# Altium footprint library alex_footprint.PcbLib: 262 footprints (part 15 of 17)
Each footprint in its own frame and in the unit in brackets; x right, y up, seen from the top. Pads: shape width x height; smd on the part's side, far side on the other; paste and mask are expansions set on the pad; w line width, h text height; cw(c..) or ccw(c..) is an arc to the next point about the centre after c.
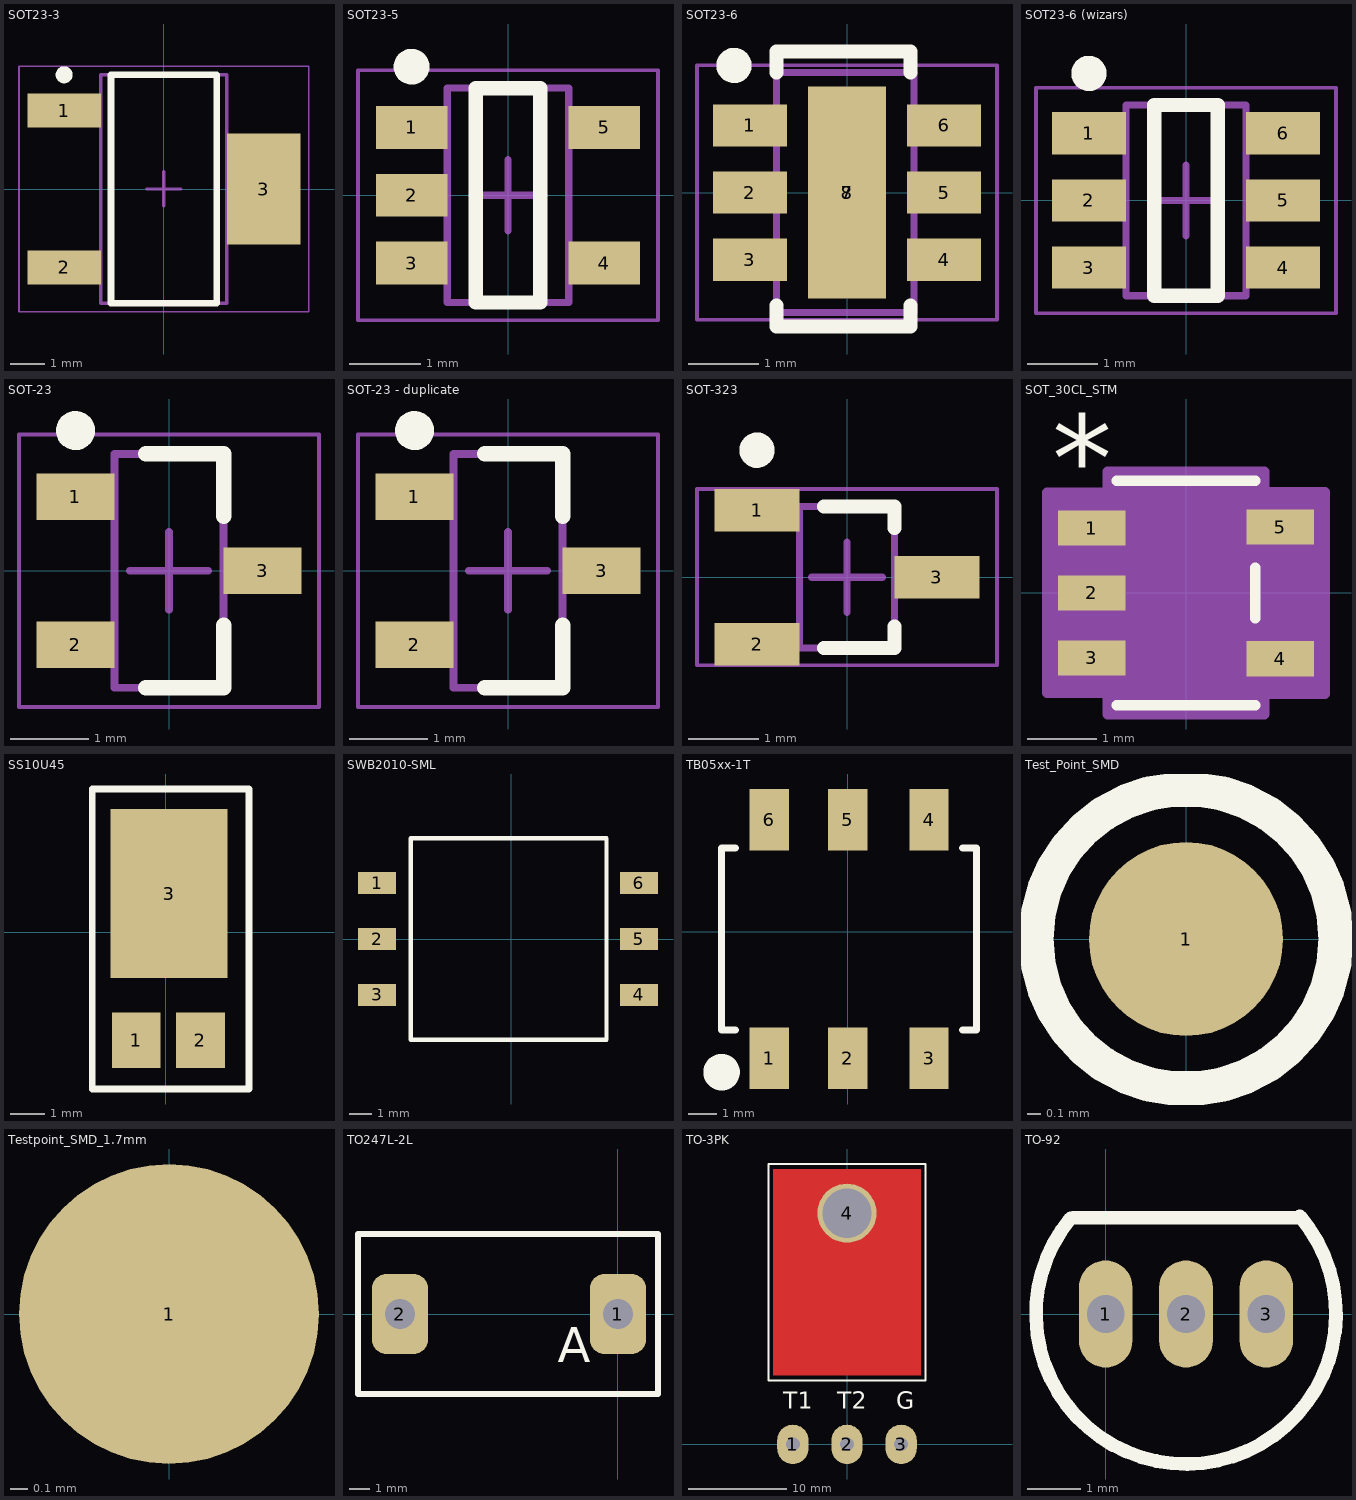
[diagram p14: the footprints below, top view; thin cyan lines are the x and y axes]

## SOT23-3 [mm] "SOT223, 4-Leads, Body 6,50x7,00mm (avg), Pitch 2,30mm, IPC Medium Density"
height 1.8
pads (3):
  rect 2.15x1 smd: 1(-2.925,2.3) 2(-2.925,-2.3)
  rect 2.15x3.25 smd: 3(2.925,0)
Top Overlay:
  circle w0.25: c-2.925,3.35 r0.125
  lines w0.2: -1.55,-3.35 -1.55,3.35 1.55,3.35 1.55,-3.35 -1.55,-3.35
Mechanical 13:
  lines w0.1: -1.85,-3.35 -1.85,3.35 1.85,3.35 1.85,-3.35 -1.85,-3.35
Mechanical 15:
  lines w0.05: -4.25,-3.6 -4.25,3.6 4.25,3.6 4.25,-3.6 -4.25,-3.6
  lines w0.1: -0.5,0 0.5,0 ; 0,-0.5 0,0.5
3D body: height 1.8, standoff 0.02, extent -1.85,-3.35 1.85,3.35

## SOT23-5 [mm] "SOT23, 5-Leads, Body 3,00x2,80mm, Pitch 0,95mm, IPC Medium Density"
height 1.25
pads (5):
  rect 1x0.6 smd: 1(-1.35,0.95) 2(-1.35,0) 3(-1.35,-0.95) 4(1.35,-0.95) 5(1.35,0.95)
Top Overlay:
  circle w0.25: c-1.35,1.8 r0.125
  lines w0.2: -0.45,-1.5 0.45,-1.5 0.45,1.5 -0.45,1.5 -0.45,-1.5
Mechanical 13:
  lines w0.1: -0.85,-1.5 -0.85,1.5 0.85,1.5 0.85,-1.5 -0.85,-1.5
Mechanical 15:
  lines w0.05: -2.1,-1.75 -2.1,1.75 2.1,1.75 2.1,-1.75 -2.1,-1.75
  lines w0.1: -0.5,0 0.5,0 ; 0,-0.5 0,0.5
3D body: height 1.25, standoff 0.1, extent -0.85,-1.5 0.85,1.5

## SOT23-6 [mm]
height 0.95
pads (8):
  rect 1.05x0.6 smd: 1(-1.375,0.95) 2(-1.375,0) 3(-1.375,-0.95) 4(1.375,-0.95) 5(1.375,0) 6(1.375,0.95)
  rect 1.1x3 smd: 7(0,0) 8(0,0)
Top Overlay:
  circle w0.25: c-1.6,1.8 r0.125
  lines w0.2: -1,-1.6 -1,-1.9 0.9,-1.9 0.9,-1.6 ; -1,1.7 -1,2 0.9,2 0.9,1.7
Mechanical 13:
  lines w0.1: -1,-1.7 -1,1.7 0.95,1.7 0.95,-1.7 -1,-1.7
Mechanical 15:
  lines w0.05: -2.125,-1.8 -2.125,1.8 2.125,1.8 2.125,-1.8 -2.125,-1.8
  lines w0.1: -0.5,0 0.5,0 ; 0,-0.5 0,0.5
3D body: height 0.95, standoff 0.1, extent -1,-1.7 1,1.7

## SOT23-6 (wizars) [mm]
height 0.95
pads (6):
  rect 1.05x0.6 smd: 1(-1.375,0.95) 2(-1.375,0) 3(-1.375,-0.95) 4(1.375,-0.95) 5(1.375,0) 6(1.375,0.95)
Top Overlay:
  circle w0.25: c-1.375,1.8 r0.125
  lines w0.2: -0.45,-1.35 -0.45,1.35 0.45,1.35 0.45,-1.35 -0.45,-1.35
Mechanical 13:
  lines w0.1: -0.85,-1.35 0.85,-1.35 0.85,1.35 -0.85,1.35 -0.85,-1.35
Mechanical 15:
  lines w0.05: -2.125,-1.6 2.125,-1.6 2.125,1.6 -2.125,1.6 -2.125,-1.6
  lines w0.1: -0.5,0 0.5,0 ; 0,-0.5 0,0.5
3D body: height 0.95, standoff 0.1, extent -0.85,-1.35 0.85,1.35

## SOT-23 [mm] "SOT23, 3-Leads, Body 3,00x2,45mm, Pitch 0,95mm, IPC Medium Density"
height 1.1
pads (3):
  rect 1x0.6 smd: 1(-1.2,0.95) 2(-1.2,-0.95) 3(1.2,0)
Top Overlay:
  circle w0.25: c-1.2,1.8 r0.125
  lines w0.2: -0.3,-1.5 0.7,-1.5 0.7,-0.7 ; -0.3,1.5 0.7,1.5 0.7,0.7
Mechanical 13:
  lines w0.1: -0.7,-1.5 -0.7,1.5 0.7,1.5 0.7,-1.5 -0.7,-1.5
Mechanical 15:
  lines w0.05: -1.925,-1.75 -1.925,1.75 1.925,1.75 1.925,-1.75 -1.925,-1.75
  lines w0.1: -0.5,0 0.5,0 ; 0,-0.5 0,0.5
3D body: height 1.1, standoff 0.05, extent -0.7,-1.5 0.7,1.5

## SOT-23 - duplicate [mm] "SOT23, 3-Leads, Body 3,00x2,45mm, Pitch 0,95mm, IPC Medium Density"
height 1.1
pads (3):
  rect 1x0.6 smd: 1(-1.2,0.95) 2(-1.2,-0.95) 3(1.2,0)
Top Overlay:
  circle w0.25: c-1.2,1.8 r0.125
  lines w0.2: -0.3,-1.5 0.7,-1.5 0.7,-0.7 ; -0.3,1.5 0.7,1.5 0.7,0.7
Mechanical 13:
  lines w0.1: -0.7,-1.5 0.7,-1.5 0.7,1.5 -0.7,1.5 -0.7,-1.5
Mechanical 15:
  lines w0.05: -1.925,-1.75 1.925,-1.75 1.925,1.75 -1.925,1.75 -1.925,-1.75
  lines w0.1: -0.5,0 0.5,0 ; 0,-0.5 0,0.5
3D body: height 1.1, standoff 0.05, extent -0.7,-1.5 0.7,1.5

## SOT-323 [mm]
height 1
pads (3):
  rect 1.2x0.6 smd: 1(-1.275,0.95) 2(-1.275,-0.95) 3(1.275,0)
Top Overlay:
  circle w0.25: c-1.275,1.8 r0.125
  lines w0.2: -0.325,-1 0.675,-1 0.675,-0.7 ; -0.325,1 0.675,1 0.675,0.7
Mechanical 13:
  lines w0.1: -0.675,-1 -0.675,1 0.675,1 0.675,-1 -0.675,-1
Mechanical 15:
  lines w0.05: -2.125,-1.25 -2.125,1.25 2.125,1.25 2.125,-1.25 -2.125,-1.25
  lines w0.1: -0.5,0 0.5,0 ; 0,-0.5 0,0.5
3D body: height 1, standoff 0.1, extent -0.675,-1 0.675,1

## SOT_30CL_STM [mil]
pads (5):
  rect 38.5x20 smd paste+0 mask+0: 1(-53.75,37) 2(-53.75,0) 3(-53.75,-37) 4(53.75,-37.5) 5(53.75,37.5)
Top Overlay:
  lines w6: -39.5,-64 39.5,-64 ; -39.5,64 39.5,64 ; 39.5,-14.4 39.5,14.4
  text "*" at -76.25,52 h50
Mechanical 13:
  lines w0: -12,59 ccw(c0,59) 12,59
  lines w1: -59,-47 -34.5,-47 -34.5,-27 -59,-27 -59,-47 ; -59,-10 -34.5,-10 -34.5,10 -59,10 -59,-10 ; -59,27 -34.5,27 -34.5,47 -59,47 -59,27 ; -34.5,-59 -34.5,59 34.5,59 34.5,-59 -34.5,-59 ; 34.5,-47.5 59,-47.5 59,-27.5 34.5,-27.5 34.5,-47.5 ; 34.5,27.5 59,27.5 59,47.5 34.5,47.5 34.5,27.5
  text "*" at -37,9 h50
Mechanical 15:
  region: 44.5,-69 -44.5,-69 -44.5,-57 -79,-57 -79,57 -44.5,57 -44.5,69 44.5,69 44.5,57.5 79,57.5 79,-57.5 44.5,-57.5
  lines w6: -79,-57 -79,57 -44.5,57 -44.5,69 44.5,69 44.5,57.5 79,57.5 79,-57.5 44.5,-57.5 44.5,-69 -44.5,-69 -44.5,-57 -79,-57
3D body "SOT_30CL_STM.step": height 57.09, standoff 0, extent -59.02,-59.02 59.02,59.02

## SS10U45 [mm]
pads (3):
  rect 1.4x1.6 smd: 1(-0.84,-3.1) 2(1,-3.1)
  rect 3.36x4.85 smd: 3(0.1,1.1)
Top Overlay:
  lines w0.2: -2.1,-4.5 2.4,-4.5 2.4,4.1 -2.1,4.1 -2.1,-4.5

## SWB2010-SML [mm]
pads (6):
  rect 1.7x1 smd mask+0.25: 1(-6,2.5) 2(-6,0) 3(-6,-2.5) 4(5.7,-2.5) 5(5.7,0) 6(5.7,2.5)
Top Overlay:
  lines w0.2: -4.5,-4.5 -4.5,4.5 4.25,4.5 4.25,-4.25 4.25,-4.5 -4.5,-4.5

## TB05xx-1T [mm]
pads (6):
  rect 1.4x2.2 smd: 1(-2.8,-4.5) 2(0,-4.5) 3(2.9,-4.5) 4(2.9,4) 5(0,4) 6(-2.8,4)
Top Overlay:
  circle w1: c-4.5,-5 r0.15
  lines w0.25: -4,-3.5 -4.5,-3.5 -4.5,-2.5 -4.5,3 -4,3 ; 4.1,-3.5 4.6,-3.5 4.6,3 4.1,3
3D body "TTB05xx-1T.stp": height 3.55, standoff -0.05, extent -3.25,-4.8 3.15,4

## Test_Point_SMD [mm]
pads (1):
  round 1.4 smd: 1(0,0)
Top Overlay:
  circle w0.25: c0,0 r1.082

## Testpoint_SMD_1.7mm [mm]
pads (1):
  round 1.7 smd mask+0.25: 1(0,0)

## TO247L-2L [mm]
pads (2):
  rrect50% 2.8x4 hole 1.5 unplated mask+0.25: 1(0,0) 2(-10.9,0)
Top Overlay:
  lines w0.3: -13,-4 2,-4 2,0 2,4 -13,4 -13,-4
  text "A" at -3,-3 h3

## TO-3PK [mm]
pads (4):
  oval 3.2x4 hole 1.4 unplated mask+0.25: 1(-5.5,0) 2(0,0) 3(5.5,0)
  round 6 hole 5 unplated mask+0.25: 4(0,23.5)
Top Layer:
  rectangle: -7.5,7 7.5,28
Top Overlay:
  lines w0.2: -8,6.5 8,6.5 8,7.5 8,28.5 -8,28.5 -8,6.5
  text "G" at 5,3 h3
  text "T2" at -1,3 h3
  text "T1" at -6.5,3 h3

## TO-92 [mm]
pads (3):
  oval 1x2 hole 0.7 unplated: 1(0,0) 2(1.5,0) 3(3,0)
Top Overlay:
  lines w0.254: -0.653,1.79 ccw(c1.5,0) 3.626,1.822 ; -0.6,1.8 3.6,1.8